# Altium footprint library THU VIEN PCB.PCBLib: 911 footprints (part 30 of 57)
Each footprint in its own frame and in the unit in brackets; x right, y up, seen from the top. Pads: shape width x height; smd on the part's side, far side on the other; paste and mask are expansions set on the pad; w line width, h text height; cw(c..) or ccw(c..) is an arc to the next point about the centre after c.
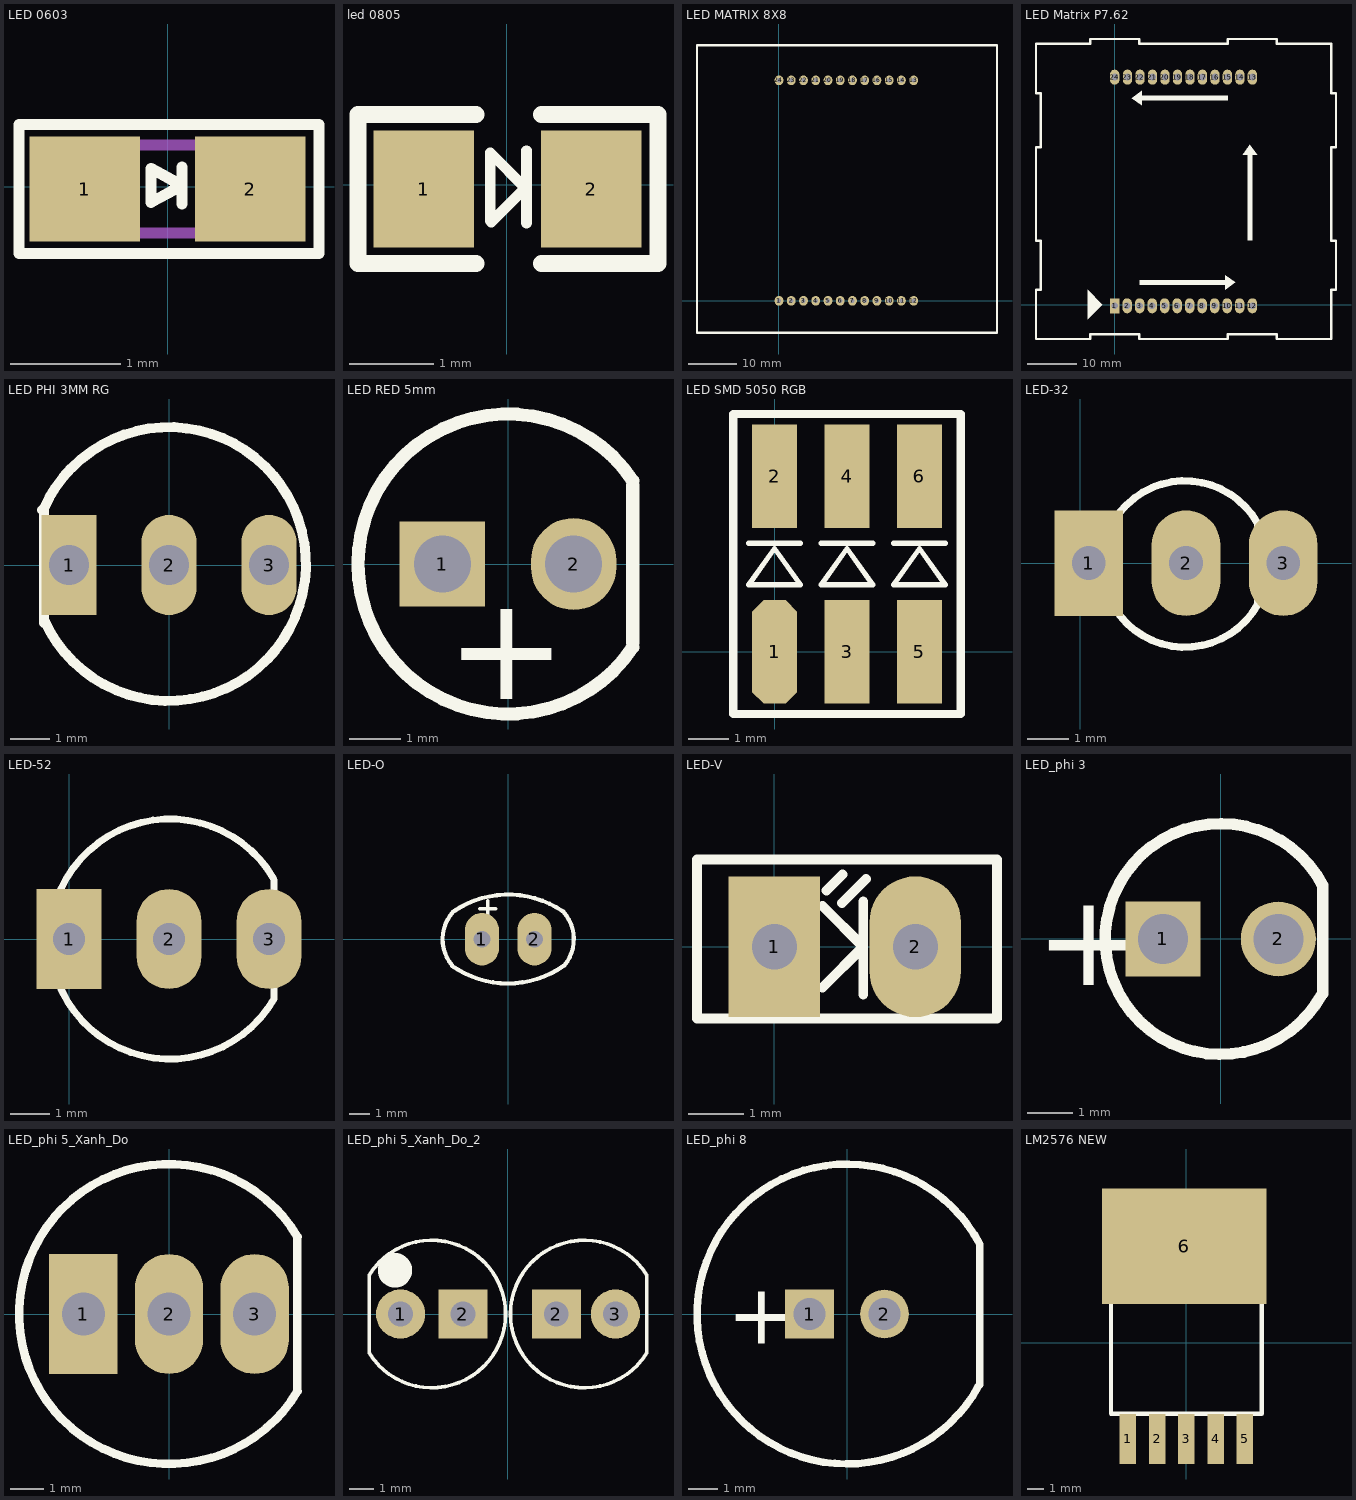
[diagram p29: the footprints below, top view; thin cyan lines are the x and y axes]

## LED 0603 [mm]
pads (2):
  rect 1x0.95 smd mask+0.076: 1(-0.753,-0.019) 2(0.747,-0.019)
Top Overlay:
  lines w0.102: -0.152,-0.139 0.127,0.014 -0.152,0.166 ; -0.152,-0.127 -0.152,0.152 ; 0.127,-0.152 0.127,0.178 ; -1.349,-0.603 -1.349,0.565 1.369,0.565 1.369,-0.603 -1.349,-0.603
Mechanical 13:
  lines w0.1: -0.803,-0.419 -0.803,0.381 0.797,0.381 0.797,-0.419 -0.803,-0.419
3D body "User Library-LED_0603_B.STEP": height 0.6, standoff 0, extent -0.8,-0.4 0.8,0.4

## led 0805 [mm]
pads (2):
  rect 1.2x1.4 smd: 1(-0.996,-0.051) 2(1.004,-0.051)
Top Overlay:
  lines w0.127: -0.199,0.381 -0.199,-0.432 -0.186,-0.445 0.22,-0.038 -0.186,0.368 ; 0.233,-0.457 0.233,0.406
  lines w0.2: -0.367,-0.94 -1.778,-0.94 -1.778,0.838 -0.367,0.838 ; 0.408,-0.94 1.803,-0.94 1.803,0.838 0.408,0.838
3D body "Led SMD 0805.step": height 1.1, standoff 0, extent -0.98,-0.65 1.04,0.6

## LED MATRIX 8X8 [mm]
pads (24):
  oval 1.8x2 hole 0.9: 1(0,0) 2(2.54,0) 3(5.08,0) 4(7.62,0) 5(10.16,0) 6(12.7,0) 7(15.24,0) 8(17.78,0) 9(20.32,0) 10(22.86,0) 11(25.4,0) 12(27.94,0) 13(27.94,45.72) 14(25.4,45.72) 15(22.86,45.72) 16(20.32,45.72) 17(17.78,45.72) 18(15.24,45.72) 19(12.7,45.72) 20(10.16,45.72) 21(7.62,45.72) 22(5.08,45.72) 23(2.54,45.72) 24(0,45.72)
Top Overlay:
  lines w0.5: -17.006,-6.65 45.224,-6.65 45.224,53.04 -2.401,53.04 -17.006,53.04 -17.006,-6.65

## LED Matrix P7.62 [mil]
pads (24):
  rect 75x120 hole 55: 1(0,-9.84)
  oval 75x120 hole 55: 2(100,-9.84) 3(200,-9.84) 4(300,-9.84) 5(400,-9.84) 6(500,-9.84) 7(600,-9.84) 8(700,-9.84) 9(800,-9.84) 10(900,-9.84) 11(1000,-9.84) 12(1102.36,-9.84) 13(1102.36,1820.87) 14(1002.36,1820.87) 15(902.36,1820.87) 16(802.36,1820.87) 17(702.36,1820.87) 18(602.36,1820.87) 19(502.36,1820.87) 20(402.36,1820.87) 21(302.36,1820.87) 22(202.36,1820.87) 23(102.36,1820.87) 24(0,1820.87)
Top Overlay:
  region: 1102.36,511.81 1102.36,1200.79 1062.99,1200.79 1062.99,511.81
  region: 905.51,1673.23 216.54,1673.23 216.54,1633.86 905.51,1633.86
  rectangle: 196.85,157.48 885.83,196.85
  region: 1141.73,1200.79 1023.62,1200.79 1082.68,1279.53
  region: 216.54,1712.6 216.54,1594.49 137.8,1653.54
  region: 885.83,236.22 885.83,118.11 964.57,177.17
  region: -216.54,-118.11 -216.54,118.11 -98.43,0
  lines w20: -629.92,-275.59 -629.92,118.11 -590.55,118.11 -590.55,511.81 -629.92,511.81 -629.92,1259.84 -590.55,1259.84 -590.55,1692.91 -629.92,1692.91 -629.92,2086.61 -196.85,2086.61 -196.85,2125.98 196.85,2125.98 196.85,2086.61 905.51,2086.61 905.51,2125.98 1299.21,2125.98 1299.21,2086.61 1732.28,2086.61 1732.28,1692.91 1771.65,1692.91 1771.65,1259.84 1732.28,1259.84 1732.28,511.81 1771.65,511.81 1771.65,118.11 1732.28,118.11 1732.28,-275.59 1299.21,-275.59 1299.21,-236.22 905.51,-236.22 905.51,-275.59 196.85,-275.59 196.85,-236.22 -196.85,-236.22 -196.85,-275.59 -629.92,-275.59

## LED PHI 3MM RG [mil]
pads (3):
  rect 55x100 hole 40: 1(-100,0)
  oval 55x100 hole 40: 2(0,0) 3(100,0)
Top Overlay:
  lines w10: -125.65,55.23 cw(c0,1) -124.2,-56.47 ; -125,-58 -125,55 ; -125,55 -127,55 -125,55
3D body "User Library-LED RG.step": height 311.26, standoff -217.48, extent -88.58,-78.74 88.58,78.74

## LED RED 5mm [mil] "LED phi 5mm"
height 649.61
pads (2):
  rect 65x65 hole 43.31: 1(-50,0)
  oval 65x70 hole 43.31: 2(50,0)
Top Overlay:
  lines w10: 95,-63.33 cw(c0,0) 95,63.33 ; 95,-60 95,60
  text "+" at -47,-103 h80
3D body "LED RED 5mm.STEP": height 352.76, standoff -255.3, extent -118.11,-118.11 98.43,118.11

## LED SMD 5050 RGB [mil]
pads (6):
  oct 43.31x100 smd: 1(0,0)
  rect 43.31x100 smd: 2(0,170) 3(70,0) 4(70,170) 5(140,0) 6(140,170)
Top Overlay:
  lines w5: -25,105 25,105 ; 45,105 95,105 ; 115,105 165,105 ; -25,65 25,65 0,100 -25,65 ; 45,65 95,65 70,100 45,65 ; 115,65 165,65 140,100 115,65
  lines w8: -40,-60 -40,230 180,230 180,-60 -40,-60
3D body "LED SMD 5050.step": height 63.49, standoff 0.5, extent -28.43,-20 168.43,188.66

## LED-32 [mil] "LED 3 PIN, 3ly Two colour"
height 300
pads (3):
  rect 65x100 hole 32: 1(8,0)
  oval 65x100 hole 32: 2(100,0) 3(192,0)
Top Overlay:
  lines w7: 168,-39 168,37
  lines w7.01: 167.87,37.48 ccw(c99.08,-0.84) 167.97,-38.98

## LED-52 [mil] "LED 3 PIN, 5 ly , Two colour"
height 300
pads (3):
  rect 65x100 hole 32: 1(0,0)
  oval 65x100 hole 32: 2(100,0) 3(200,0)
Top Overlay:
  lines w7: 204.51,60.71 ccw(c101,0) 204.94,-59.97 ; 205,-59 205,59
3D body "User Library-led 5mm 3 pin.step": height 475.59, standoff -154.33, extent -19.81,-115.17 214.17,113.18

## LED-O [mil] "LED 2 PIN,  Ovan Only colour, pin to pin 110mil"
height 300
pads (2):
  oval 65x100 hole 32: 1(-50,0) 2(50,0)
Top Overlay:
  lines w7: -54,58 -24,58 ; -39,43 -39,73
  lines w8: -106.82,-49.85 cw(c-47,0) -104.5,52.5 ; -106.38,-51.11 ccw(c-0.81,100.81) 104.97,-50.96 ; -102.83,53.79 cw(c0,-100) 103.93,53.04 ; 104.5,52.5 cw(c47,0) 106.82,-49.85

## LED-V [mil] "LED 2 PIN, Rectang Only colour"
height 300
pads (2):
  rect 65x100 hole 32: 1(0,0)
  oval 65x100 hole 32: 2(100,0)
Top Overlay:
  lines w7: 34,-29 63,0 34,29 ; 37,40 48.3,51.3 ; 48,31 65,48 ; 63,-34 63,32 ; -55,-51 -55,62 158,62 158,-51 -55,-51

## LED_phi 3 [mil] "LED phi 3"
height 236.22
pads (2):
  rect 65x65 hole 43.31: 1(-50,0)
  round 65 hole 43.31: 2(50,0)
Top Overlay:
  lines w10: 87.62,-48.19 cw(c0,0) 88.49,46.58 88.49,-47.32
  text "+" at -160,-40 h80

## LED_phi 5_Xanh_Do [mil] "LED phi 5mm 2 mau xanh va do"
height 314.96
pads (3):
  rect 80x140 hole 50: 1(-100,0)
  oval 80x140 hole 50: 2(0,0) 3(100,0)
Top Overlay:
  lines w10: 150,-90 150,90 ; 150.23,-90.14 cw(c0,0) 150.23,90.14

## LED_phi 5_Xanh_Do_2 [mm] "LED phi 5mm 2 mau xanh va do doc lap"
height 8
pads (4):
  round 2 hole 1: 1(-4.37,0) 3(4.37,0)
  rect 2x2 hole 1: 2(-1.83,0) 2(1.97,0)
Top Overlay:
  circle w1: c-4.594,1.778 r0.2
  lines w0.15: -5.64,-1.6 -5.64,1.575 ; -5.638,-1.599 ccw(c-3.1,0) -5.638,1.599 ; 5.638,-1.575 5.638,1.6 ; 5.638,-1.599 cw(c3.1,0) 5.638,1.599

## LED_phi 8 [mil] "LED phi 8mm"
height 649.61
pads (2):
  rect 65x65 hole 43.31: 1(-50,0)
  round 65 hole 43.31: 2(50,0)
Top Overlay:
  lines w10: 175.24,-96.38 cw(c0,0) 176.98,93.15 176.98,-94.64
  text "+" at -160,-40 h80

## LM2576 NEW [mil]
pads (6):
  rect 39.37x120 smd: 1(-140,-230) 2(-70,-230) 3(0,-230) 4(70,-230) 5(140,-230)
  rect 393.7x275.59 smd: 6(-5,230)
Top Overlay:
  lines w10: -160,170 -160,240 -140,260 140,260 160,240 160,170 ; -180,-170 -180,170 180,170 180,-170 -180,-170
3D body "TO-263-5.STEP": height 180.12, standoff 0.6, extent -200,-241.79 200,309.98